# Altium schematic symbol library jlcpcb_2025_04_capacitors_extended_0201.schlib: 1175 symbols (part 6 of 7)
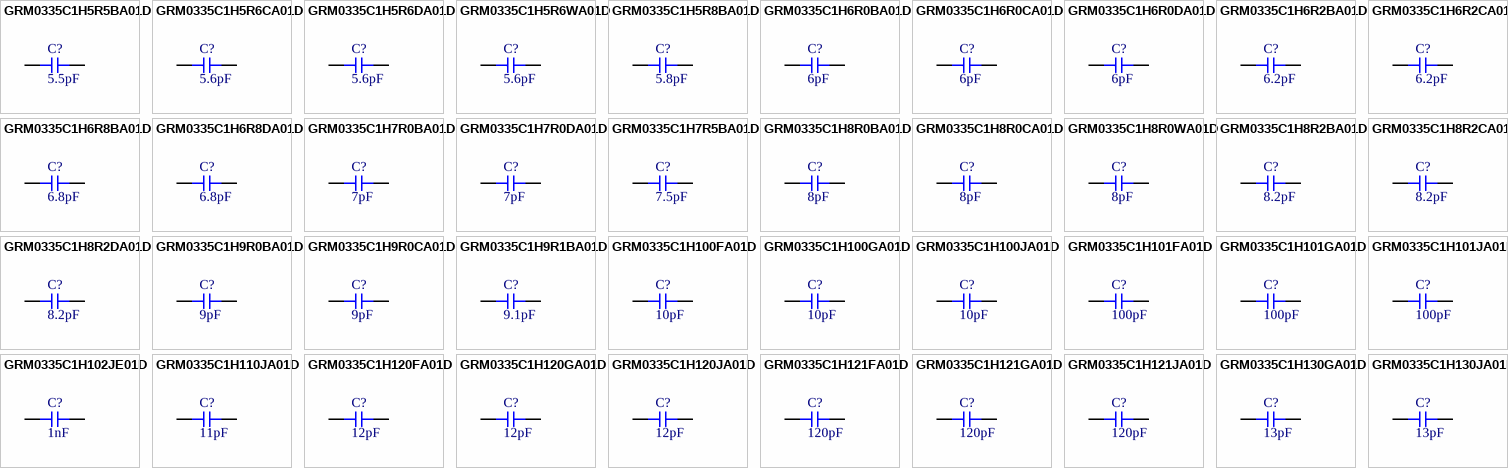
[diagram p34: symbols GRM0335C1H5R5BA01D to GRM0335C1H130JA01D]

## GRM0335C1H5R6CA01D
designator C?  Capacitance: 5.6pF  (hidden comment: *)
Capacitor, Ceramic (MLCC), 5.6pF, 50V, C0G, SMD 0201; Manufacturer: Murata Electronics; Manufacturer Part Number: GRM0335C1H5R6CA01D; Package Size: 0201; JLCPCB Basic Part: No; JLCPCB Part Number: C85914; Supplier 1: LCSC; Category: Capacitors - MLCC; Supplier Part Number 1: C85914; Voltage Rating: 50V; Temperature Coefficient: C0G; RoHS: Yes; ComponentLink1Description: Datasheet; ComponentLink1URL: https://wmsc.lcsc.com/wmsc/upload/file/pdf/v2/lcsc/2304140030_Murata-Electronics-GRM0335C1H5R6CA01D_C85914.pdf; ComponentLink2Description: JLCPCB Part URL; ComponentLink2URL: https://jlcpcb.com/partdetail/C85914; ComponentLink3Description: LCSC Part URL; ComponentLink3URL: https://lcsc.com/product-detail/Multilayer-Ceramic-Capacitors-MLCC---SMD-SMT_Murata-Electronics-Murata-Electronics-GRM0335C1H5R6CA01D_C85914.html
footprint CAP-0201 (0201 (0603M) Capacitor)
pins: 1, 2

## GRM0335C1H5R6DA01D
designator C?  Capacitance: 5.6pF  (hidden comment: *)
Capacitor, Ceramic (MLCC), 5.6pF, null, null, SMD 0201; Manufacturer: Murata Electronics; Manufacturer Part Number: GRM0335C1H5R6DA01D; Package Size: 0201; JLCPCB Basic Part: No; JLCPCB Part Number: C489846; Supplier 1: LCSC; Category: Capacitors - MLCC; Supplier Part Number 1: C489846; Voltage Rating: null; Temperature Coefficient: null; RoHS: Yes; ComponentLink1Description: Datasheet; ComponentLink1URL: https://wmsc.lcsc.com/wmsc/upload/file/pdf/v2/lcsc/2003031432_Murata-Electronics-GRM0335C1H5R6DA01D_C489846.pdf; ComponentLink2Description: JLCPCB Part URL; ComponentLink2URL: https://jlcpcb.com/partdetail/C489846; ComponentLink3Description: LCSC Part URL; ComponentLink3URL: https://lcsc.com/product-detail/Multilayer-Ceramic-Capacitors-MLCC---SMD-SMT_Murata-Electronics-Murata-Electronics-GRM0335C1H5R6DA01D_C489846.html
footprint CAP-0201 (0201 (0603M) Capacitor)
pins: 1, 2

## GRM0335C1H5R6WA01D
designator C?  Capacitance: 5.6pF  (hidden comment: *)
Capacitor, Ceramic (MLCC), 5.6pF, 50V, C0G, SMD 0201; Manufacturer: Murata Electronics; Manufacturer Part Number: GRM0335C1H5R6WA01D; Package Size: 0201; JLCPCB Basic Part: No; JLCPCB Part Number: C1864518; Supplier 1: LCSC; Category: Capacitors - MLCC; Supplier Part Number 1: C1864518; Voltage Rating: 50V; Temperature Coefficient: C0G; RoHS: Yes; ComponentLink1Description: Datasheet; ComponentLink1URL: https://wmsc.lcsc.com/wmsc/upload/file/pdf/v2/lcsc/2201111430_Murata-Electronics-GRM0335C1H5R6WA01D_C1864518.pdf; ComponentLink2Description: JLCPCB Part URL; ComponentLink2URL: https://jlcpcb.com/partdetail/C1864518; ComponentLink3Description: LCSC Part URL; ComponentLink3URL: https://lcsc.com/product-detail/Multilayer-Ceramic-Capacitors-MLCC---SMD-SMT_Murata-Electronics-Murata-Electronics-GRM0335C1H5R6WA01D_C1864518.html
footprint CAP-0201 (0201 (0603M) Capacitor)
pins: 1, 2

## GRM0335C1H5R8BA01D
designator C?  Capacitance: 5.8pF  (hidden comment: *)
Capacitor, Ceramic (MLCC), 5.8pF, 50V, null, SMD 0201; Manufacturer: Murata Electronics; Manufacturer Part Number: GRM0335C1H5R8BA01D; Package Size: 0201; JLCPCB Basic Part: No; JLCPCB Part Number: C2183849; Supplier 1: LCSC; Category: Capacitors - MLCC; Supplier Part Number 1: C2183849; Voltage Rating: 50V; Temperature Coefficient: null; RoHS: Yes; ComponentLink1Description: Datasheet; ComponentLink1URL: https://wmsc.lcsc.com/wmsc/upload/file/pdf/v2/lcsc/2202041400_Murata-Electronics-GRM0335C1H5R8BA01D_C2183849.pdf; ComponentLink2Description: JLCPCB Part URL; ComponentLink2URL: https://jlcpcb.com/partdetail/C2183849; ComponentLink3Description: LCSC Part URL; ComponentLink3URL: https://lcsc.com/product-detail/Multilayer-Ceramic-Capacitors-MLCC---SMD-SMT_Murata-Electronics-Murata-Electronics-GRM0335C1H5R8BA01D_C2183849.html
footprint CAP-0201 (0201 (0603M) Capacitor)
pins: 1, 2

## GRM0335C1H6R0BA01D
designator C?  Capacitance: 6pF  (hidden comment: *)
Capacitor, Ceramic (MLCC), 6pF, 50V, C0G, SMD 0201; Manufacturer: Murata Electronics; Manufacturer Part Number: GRM0335C1H6R0BA01D; Package Size: 0201; JLCPCB Basic Part: No; JLCPCB Part Number: C161434; Supplier 1: LCSC; Category: Capacitors - MLCC; Supplier Part Number 1: C161434; Voltage Rating: 50V; Temperature Coefficient: C0G; RoHS: Yes; ComponentLink1Description: Datasheet; ComponentLink1URL: https://wmsc.lcsc.com/wmsc/upload/file/pdf/v2/lcsc/2304140030_Murata-Electronics-GRM0335C1H6R0BA01D_C161434.pdf; ComponentLink2Description: JLCPCB Part URL; ComponentLink2URL: https://jlcpcb.com/partdetail/C161434; ComponentLink3Description: LCSC Part URL; ComponentLink3URL: https://lcsc.com/product-detail/Multilayer-Ceramic-Capacitors-MLCC---SMD-SMT_Murata-Electronics-Murata-Electronics-GRM0335C1H6R0BA01D_C161434.html
footprint CAP-0201 (0201 (0603M) Capacitor)
pins: 1, 2

## GRM0335C1H6R0CA01D
designator C?  Capacitance: 6pF  (hidden comment: *)
Capacitor, Ceramic (MLCC), 6pF, 50V, C0G, SMD 0201; Manufacturer: Murata Electronics; Manufacturer Part Number: GRM0335C1H6R0CA01D; Package Size: 0201; JLCPCB Basic Part: No; JLCPCB Part Number: C85915; Supplier 1: LCSC; Category: Capacitors - MLCC; Supplier Part Number 1: C85915; Voltage Rating: 50V; Temperature Coefficient: C0G; RoHS: Yes; ComponentLink1Description: Datasheet; ComponentLink1URL: https://wmsc.lcsc.com/wmsc/upload/file/pdf/v2/lcsc/2304140030_Murata-Electronics-GRM0335C1H6R0CA01D_C85915.pdf; ComponentLink2Description: JLCPCB Part URL; ComponentLink2URL: https://jlcpcb.com/partdetail/C85915; ComponentLink3Description: LCSC Part URL; ComponentLink3URL: https://lcsc.com/product-detail/Multilayer-Ceramic-Capacitors-MLCC---SMD-SMT_Murata-Electronics-Murata-Electronics-GRM0335C1H6R0CA01D_C85915.html
footprint CAP-0201 (0201 (0603M) Capacitor)
pins: 1, 2

## GRM0335C1H6R0DA01D
designator C?  Capacitance: 6pF  (hidden comment: *)
Capacitor, Ceramic (MLCC), 6pF, 50V, C0G, SMD 0201; Manufacturer: Murata Electronics; Manufacturer Part Number: GRM0335C1H6R0DA01D; Package Size: 0201; JLCPCB Basic Part: No; JLCPCB Part Number: C161435; Supplier 1: LCSC; Category: Capacitors - MLCC; Supplier Part Number 1: C161435; Voltage Rating: 50V; Temperature Coefficient: C0G; RoHS: Yes; ComponentLink1Description: Datasheet; ComponentLink1URL: https://wmsc.lcsc.com/wmsc/upload/file/pdf/v2/lcsc/1811081513_Murata-Electronics-GRM0335C1H6R0DA01D_C161435.pdf; ComponentLink2Description: JLCPCB Part URL; ComponentLink2URL: https://jlcpcb.com/partdetail/C161435; ComponentLink3Description: LCSC Part URL; ComponentLink3URL: https://lcsc.com/product-detail/Multilayer-Ceramic-Capacitors-MLCC---SMD-SMT_Murata-Electronics-Murata-Electronics-GRM0335C1H6R0DA01D_C161435.html
footprint CAP-0201 (0201 (0603M) Capacitor)
pins: 1, 2

## GRM0335C1H6R2BA01D
designator C?  Capacitance: 6.2pF  (hidden comment: *)
Capacitor, Ceramic (MLCC), 6.2pF, null, null, SMD 0201; Manufacturer: Murata Electronics; Manufacturer Part Number: GRM0335C1H6R2BA01D; Package Size: 0201; JLCPCB Basic Part: No; JLCPCB Part Number: C385002; Supplier 1: LCSC; Category: Capacitors - MLCC; Supplier Part Number 1: C385002; Voltage Rating: null; Temperature Coefficient: null; RoHS: Yes; ComponentLink1Description: Datasheet; ComponentLink1URL: https://wmsc.lcsc.com/wmsc/upload/file/pdf/v2/lcsc/2104161832_Murata-Electronics-GRM0335C1H6R2BA01D_C385002.pdf; ComponentLink2Description: JLCPCB Part URL; ComponentLink2URL: https://jlcpcb.com/partdetail/C385002; ComponentLink3Description: LCSC Part URL; ComponentLink3URL: https://lcsc.com/product-detail/Multilayer-Ceramic-Capacitors-MLCC---SMD-SMT_Murata-Electronics-Murata-Electronics-GRM0335C1H6R2BA01D_C385002.html
footprint CAP-0201 (0201 (0603M) Capacitor)
pins: 1, 2

## GRM0335C1H6R2CA01D
designator C?  Capacitance: 6.2pF  (hidden comment: *)
Capacitor, Ceramic (MLCC), 6.2pF, 50V, C0G, SMD 0201; Manufacturer: Murata Electronics; Manufacturer Part Number: GRM0335C1H6R2CA01D; Package Size: 0201; JLCPCB Basic Part: No; JLCPCB Part Number: C385003; Supplier 1: LCSC; Category: Capacitors - MLCC; Supplier Part Number 1: C385003; Voltage Rating: 50V; Temperature Coefficient: C0G; RoHS: Yes; ComponentLink1Description: Datasheet; ComponentLink1URL: https://wmsc.lcsc.com/wmsc/upload/file/pdf/v2/lcsc/2109180930_Murata-Electronics-GRM0335C1H6R2CA01D_C385003.pdf; ComponentLink2Description: JLCPCB Part URL; ComponentLink2URL: https://jlcpcb.com/partdetail/C385003; ComponentLink3Description: LCSC Part URL; ComponentLink3URL: https://lcsc.com/product-detail/Multilayer-Ceramic-Capacitors-MLCC---SMD-SMT_Murata-Electronics-Murata-Electronics-GRM0335C1H6R2CA01D_C385003.html
footprint CAP-0201 (0201 (0603M) Capacitor)
pins: 1, 2

## GRM0335C1H6R8BA01D
designator C?  Capacitance: 6.8pF  (hidden comment: *)
Capacitor, Ceramic (MLCC), 6.8pF, 50V, C0G, SMD 0201; Manufacturer: Murata Electronics; Manufacturer Part Number: GRM0335C1H6R8BA01D; Package Size: 0201; JLCPCB Basic Part: No; JLCPCB Part Number: C237537; Supplier 1: LCSC; Category: Capacitors - MLCC; Supplier Part Number 1: C237537; Voltage Rating: 50V; Temperature Coefficient: C0G; RoHS: Yes; ComponentLink1Description: Datasheet; ComponentLink1URL: https://wmsc.lcsc.com/wmsc/upload/file/pdf/v2/lcsc/2304140030_Murata-Electronics-GRM0335C1H6R8BA01D_C237537.pdf; ComponentLink2Description: JLCPCB Part URL; ComponentLink2URL: https://jlcpcb.com/partdetail/C237537; ComponentLink3Description: LCSC Part URL; ComponentLink3URL: https://lcsc.com/product-detail/Multilayer-Ceramic-Capacitors-MLCC---SMD-SMT_Murata-Electronics-Murata-Electronics-GRM0335C1H6R8BA01D_C237537.html
footprint CAP-0201 (0201 (0603M) Capacitor)
pins: 1, 2

## GRM0335C1H6R8DA01D
designator C?  Capacitance: 6.8pF  (hidden comment: *)
Capacitor, Ceramic (MLCC), 6.8pF, 50V, C0G, SMD 0201; Manufacturer: Murata Electronics; Manufacturer Part Number: GRM0335C1H6R8DA01D; Package Size: 0201; JLCPCB Basic Part: No; JLCPCB Part Number: C576428; Supplier 1: LCSC; Category: Capacitors - MLCC; Supplier Part Number 1: C576428; Voltage Rating: 50V; Temperature Coefficient: C0G; RoHS: Yes; ComponentLink1Description: Datasheet; ComponentLink1URL: https://wmsc.lcsc.com/wmsc/upload/file/pdf/v2/lcsc/2206021745_Murata-Electronics-GRM0335C1H6R8DA01D_C576428.pdf; ComponentLink2Description: JLCPCB Part URL; ComponentLink2URL: https://jlcpcb.com/partdetail/C576428; ComponentLink3Description: LCSC Part URL; ComponentLink3URL: https://lcsc.com/product-detail/Multilayer-Ceramic-Capacitors-MLCC---SMD-SMT_Murata-Electronics-Murata-Electronics-GRM0335C1H6R8DA01D_C576428.html
footprint CAP-0201 (0201 (0603M) Capacitor)
pins: 1, 2

## GRM0335C1H7R0BA01D
designator C?  Capacitance: 7pF  (hidden comment: *)
Capacitor, Ceramic (MLCC), 7pF, 50V, C0G, SMD 0201; Manufacturer: Murata Electronics; Manufacturer Part Number: GRM0335C1H7R0BA01D; Package Size: 0201; JLCPCB Basic Part: No; JLCPCB Part Number: C161436; Supplier 1: LCSC; Category: Capacitors - MLCC; Supplier Part Number 1: C161436; Voltage Rating: 50V; Temperature Coefficient: C0G; RoHS: Yes; ComponentLink1Description: Datasheet; ComponentLink1URL: https://wmsc.lcsc.com/wmsc/upload/file/pdf/v2/lcsc/2304140030_Murata-Electronics-GRM0335C1H7R0BA01D_C161436.pdf; ComponentLink2Description: JLCPCB Part URL; ComponentLink2URL: https://jlcpcb.com/partdetail/C161436; ComponentLink3Description: LCSC Part URL; ComponentLink3URL: https://lcsc.com/product-detail/Multilayer-Ceramic-Capacitors-MLCC---SMD-SMT_Murata-Electronics-Murata-Electronics-GRM0335C1H7R0BA01D_C161436.html
footprint CAP-0201 (0201 (0603M) Capacitor)
pins: 1, 2

## GRM0335C1H7R0DA01D
designator C?  Capacitance: 7pF  (hidden comment: *)
Capacitor, Ceramic (MLCC), 7pF, 50V, X7T, SMD 0201; Manufacturer: Murata Electronics; Manufacturer Part Number: GRM0335C1H7R0DA01D; Package Size: 0201; JLCPCB Basic Part: No; JLCPCB Part Number: C385005; Supplier 1: LCSC; Category: Capacitors - MLCC; Supplier Part Number 1: C385005; Voltage Rating: 50V; Temperature Coefficient: X7T; RoHS: Yes; ComponentLink1Description: Datasheet; ComponentLink1URL: https://wmsc.lcsc.com/wmsc/upload/file/pdf/v2/lcsc/2108182030_Murata-Electronics-GRM0335C1H7R0DA01D_C385005.pdf; ComponentLink2Description: JLCPCB Part URL; ComponentLink2URL: https://jlcpcb.com/partdetail/C385005; ComponentLink3Description: LCSC Part URL; ComponentLink3URL: https://lcsc.com/product-detail/Multilayer-Ceramic-Capacitors-MLCC---SMD-SMT_Murata-Electronics-Murata-Electronics-GRM0335C1H7R0DA01D_C385005.html
footprint CAP-0201 (0201 (0603M) Capacitor)
pins: 1, 2

## GRM0335C1H7R5BA01D
designator C?  Capacitance: 7.5pF  (hidden comment: *)
Capacitor, Ceramic (MLCC), 7.5pF, null, null, SMD 0201; Manufacturer: Murata Electronics; Manufacturer Part Number: GRM0335C1H7R5BA01D; Package Size: 0201; JLCPCB Basic Part: No; JLCPCB Part Number: C385006; Supplier 1: LCSC; Category: Capacitors - MLCC; Supplier Part Number 1: C385006; Voltage Rating: null; Temperature Coefficient: null; RoHS: Yes; ComponentLink1Description: Datasheet; ComponentLink1URL: https://wmsc.lcsc.com/wmsc/upload/file/pdf/v2/lcsc/2304140030_Murata-Electronics-GRM0335C1H7R5BA01D_C385006.pdf; ComponentLink2Description: JLCPCB Part URL; ComponentLink2URL: https://jlcpcb.com/partdetail/C385006; ComponentLink3Description: LCSC Part URL; ComponentLink3URL: https://lcsc.com/product-detail/Multilayer-Ceramic-Capacitors-MLCC---SMD-SMT_Murata-Electronics-Murata-Electronics-GRM0335C1H7R5BA01D_C385006.html
footprint CAP-0201 (0201 (0603M) Capacitor)
pins: 1, 2

## GRM0335C1H8R0BA01D
designator C?  Capacitance: 8pF  (hidden comment: *)
Capacitor, Ceramic (MLCC), 8pF, 50V, C0G, SMD 0201; Manufacturer: Murata Electronics; Manufacturer Part Number: GRM0335C1H8R0BA01D; Package Size: 0201; JLCPCB Basic Part: No; JLCPCB Part Number: C237417; Supplier 1: LCSC; Category: Capacitors - MLCC; Supplier Part Number 1: C237417; Voltage Rating: 50V; Temperature Coefficient: C0G; RoHS: Yes; ComponentLink1Description: Datasheet; ComponentLink1URL: https://wmsc.lcsc.com/wmsc/upload/file/pdf/v2/lcsc/1912111437_Murata-Electronics-GRM0335C1H8R0BA01D_C237417.pdf; ComponentLink2Description: JLCPCB Part URL; ComponentLink2URL: https://jlcpcb.com/partdetail/C237417; ComponentLink3Description: LCSC Part URL; ComponentLink3URL: https://lcsc.com/product-detail/Multilayer-Ceramic-Capacitors-MLCC---SMD-SMT_Murata-Electronics-Murata-Electronics-GRM0335C1H8R0BA01D_C237417.html
footprint CAP-0201 (0201 (0603M) Capacitor)
pins: 1, 2

## GRM0335C1H8R0CA01D
designator C?  Capacitance: 8pF  (hidden comment: *)
Capacitor, Ceramic (MLCC), 8pF, 50V, C0G, SMD 0201; Manufacturer: Murata Electronics; Manufacturer Part Number: GRM0335C1H8R0CA01D; Package Size: 0201; JLCPCB Basic Part: No; JLCPCB Part Number: C85917; Supplier 1: LCSC; Category: Capacitors - MLCC; Supplier Part Number 1: C85917; Voltage Rating: 50V; Temperature Coefficient: C0G; RoHS: Yes; ComponentLink1Description: Datasheet; ComponentLink1URL: https://wmsc.lcsc.com/wmsc/upload/file/pdf/v2/lcsc/2304140030_Murata-Electronics-GRM0335C1H8R0CA01D_C85917.pdf; ComponentLink2Description: JLCPCB Part URL; ComponentLink2URL: https://jlcpcb.com/partdetail/C85917; ComponentLink3Description: LCSC Part URL; ComponentLink3URL: https://lcsc.com/product-detail/Multilayer-Ceramic-Capacitors-MLCC---SMD-SMT_Murata-Electronics-Murata-Electronics-GRM0335C1H8R0CA01D_C85917.html
footprint CAP-0201 (0201 (0603M) Capacitor)
pins: 1, 2

## GRM0335C1H8R0WA01D
designator C?  Capacitance: 8pF  (hidden comment: *)
Capacitor, Ceramic (MLCC), 8pF, 50V, C0G, SMD 0201; Manufacturer: Murata Electronics; Manufacturer Part Number: GRM0335C1H8R0WA01D; Package Size: 0201; JLCPCB Basic Part: No; JLCPCB Part Number: C3840357; Supplier 1: LCSC; Category: Capacitors - MLCC; Supplier Part Number 1: C3840357; Voltage Rating: 50V; Temperature Coefficient: C0G; RoHS: Yes; ComponentLink1Description: Datasheet; ComponentLink1URL: https://wmsc.lcsc.com/wmsc/upload/file/pdf/v2/lcsc/2308111501_Murata-Electronics-GRM0335C1H8R0WA01D_C3840357.pdf; ComponentLink2Description: JLCPCB Part URL; ComponentLink2URL: https://jlcpcb.com/partdetail/C3840357; ComponentLink3Description: LCSC Part URL; ComponentLink3URL: https://lcsc.com/product-detail/Multilayer-Ceramic-Capacitors-MLCC---SMD-SMT_Murata-Electronics-Murata-Electronics-GRM0335C1H8R0WA01D_C3840357.html
footprint CAP-0201 (0201 (0603M) Capacitor)
pins: 1, 2

## GRM0335C1H8R2BA01D
designator C?  Capacitance: 8.2pF  (hidden comment: *)
Capacitor, Ceramic (MLCC), 8.2pF, 50V, C0G, SMD 0201; Manufacturer: Murata Electronics; Manufacturer Part Number: GRM0335C1H8R2BA01D; Package Size: 0201; JLCPCB Basic Part: No; JLCPCB Part Number: C161441; Supplier 1: LCSC; Category: Capacitors - MLCC; Supplier Part Number 1: C161441; Voltage Rating: 50V; Temperature Coefficient: C0G; RoHS: Yes; ComponentLink1Description: Datasheet; ComponentLink1URL: https://wmsc.lcsc.com/wmsc/upload/file/pdf/v2/lcsc/1811081551_Murata-Electronics-GRM0335C1H8R2BA01D_C161441.pdf; ComponentLink2Description: JLCPCB Part URL; ComponentLink2URL: https://jlcpcb.com/partdetail/C161441; ComponentLink3Description: LCSC Part URL; ComponentLink3URL: https://lcsc.com/product-detail/Multilayer-Ceramic-Capacitors-MLCC---SMD-SMT_Murata-Electronics-Murata-Electronics-GRM0335C1H8R2BA01D_C161441.html
footprint CAP-0201 (0201 (0603M) Capacitor)
pins: 1, 2

## GRM0335C1H8R2CA01D
designator C?  Capacitance: 8.2pF  (hidden comment: *)
Capacitor, Ceramic (MLCC), 8.2pF, 50V, C0G, SMD 0201; Manufacturer: Murata Electronics; Manufacturer Part Number: GRM0335C1H8R2CA01D; Package Size: 0201; JLCPCB Basic Part: No; JLCPCB Part Number: C85918; Supplier 1: LCSC; Category: Capacitors - MLCC; Supplier Part Number 1: C85918; Voltage Rating: 50V; Temperature Coefficient: C0G; RoHS: Yes; ComponentLink1Description: Datasheet; ComponentLink1URL: https://wmsc.lcsc.com/wmsc/upload/file/pdf/v2/lcsc/2304140030_Murata-Electronics-GRM0335C1H8R2CA01D_C85918.pdf; ComponentLink2Description: JLCPCB Part URL; ComponentLink2URL: https://jlcpcb.com/partdetail/C85918; ComponentLink3Description: LCSC Part URL; ComponentLink3URL: https://lcsc.com/product-detail/Multilayer-Ceramic-Capacitors-MLCC---SMD-SMT_Murata-Electronics-Murata-Electronics-GRM0335C1H8R2CA01D_C85918.html
footprint CAP-0201 (0201 (0603M) Capacitor)
pins: 1, 2

## GRM0335C1H8R2DA01D
designator C?  Capacitance: 8.2pF  (hidden comment: *)
Capacitor, Ceramic (MLCC), 8.2pF, 50V, C0G, SMD 0201; Manufacturer: Murata Electronics; Manufacturer Part Number: GRM0335C1H8R2DA01D; Package Size: 0201; JLCPCB Basic Part: No; JLCPCB Part Number: C161442; Supplier 1: LCSC; Category: Capacitors - MLCC; Supplier Part Number 1: C161442; Voltage Rating: 50V; Temperature Coefficient: C0G; RoHS: Yes; ComponentLink1Description: Datasheet; ComponentLink1URL: https://wmsc.lcsc.com/wmsc/upload/file/pdf/v2/lcsc/2304140030_Murata-Electronics-GRM0335C1H8R2DA01D_C161442.pdf; ComponentLink2Description: JLCPCB Part URL; ComponentLink2URL: https://jlcpcb.com/partdetail/C161442; ComponentLink3Description: LCSC Part URL; ComponentLink3URL: https://lcsc.com/product-detail/Multilayer-Ceramic-Capacitors-MLCC---SMD-SMT_Murata-Electronics-Murata-Electronics-GRM0335C1H8R2DA01D_C161442.html
footprint CAP-0201 (0201 (0603M) Capacitor)
pins: 1, 2

## GRM0335C1H9R0BA01D
designator C?  Capacitance: 9pF  (hidden comment: *)
Capacitor, Ceramic (MLCC), 9pF, 50V, C0G, SMD 0201; Manufacturer: Murata Electronics; Manufacturer Part Number: GRM0335C1H9R0BA01D; Package Size: 0201; JLCPCB Basic Part: No; JLCPCB Part Number: C161443; Supplier 1: LCSC; Category: Capacitors - MLCC; Supplier Part Number 1: C161443; Voltage Rating: 50V; Temperature Coefficient: C0G; RoHS: Yes; ComponentLink1Description: Datasheet; ComponentLink1URL: https://wmsc.lcsc.com/wmsc/upload/file/pdf/v2/lcsc/2304140030_Murata-Electronics-GRM0335C1H9R0BA01D_C161443.pdf; ComponentLink2Description: JLCPCB Part URL; ComponentLink2URL: https://jlcpcb.com/partdetail/C161443; ComponentLink3Description: LCSC Part URL; ComponentLink3URL: https://lcsc.com/product-detail/Multilayer-Ceramic-Capacitors-MLCC---SMD-SMT_Murata-Electronics-Murata-Electronics-GRM0335C1H9R0BA01D_C161443.html
footprint CAP-0201 (0201 (0603M) Capacitor)
pins: 1, 2

## GRM0335C1H9R0CA01D
designator C?  Capacitance: 9pF  (hidden comment: *)
Capacitor, Ceramic (MLCC), 9pF, 50V, C0G, SMD 0201; Manufacturer: Murata Electronics; Manufacturer Part Number: GRM0335C1H9R0CA01D; Package Size: 0201; JLCPCB Basic Part: No; JLCPCB Part Number: C161444; Supplier 1: LCSC; Category: Capacitors - MLCC; Supplier Part Number 1: C161444; Voltage Rating: 50V; Temperature Coefficient: C0G; RoHS: Yes; ComponentLink1Description: Datasheet; ComponentLink1URL: https://wmsc.lcsc.com/wmsc/upload/file/pdf/v2/lcsc/1912111437_Murata-Electronics-GRM0335C1H9R0CA01D_C161444.pdf; ComponentLink2Description: JLCPCB Part URL; ComponentLink2URL: https://jlcpcb.com/partdetail/C161444; ComponentLink3Description: LCSC Part URL; ComponentLink3URL: https://lcsc.com/product-detail/Multilayer-Ceramic-Capacitors-MLCC---SMD-SMT_Murata-Electronics-Murata-Electronics-GRM0335C1H9R0CA01D_C161444.html
footprint CAP-0201 (0201 (0603M) Capacitor)
pins: 1, 2

## GRM0335C1H9R1BA01D
designator C?  Capacitance: 9.1pF  (hidden comment: *)
Capacitor, Ceramic (MLCC), 9.1pF, null, null, SMD 0201; Manufacturer: Murata Electronics; Manufacturer Part Number: GRM0335C1H9R1BA01D; Package Size: 0201; JLCPCB Basic Part: No; JLCPCB Part Number: C440160; Supplier 1: LCSC; Category: Capacitors - MLCC; Supplier Part Number 1: C440160; Voltage Rating: null; Temperature Coefficient: null; RoHS: Yes; ComponentLink1Description: Datasheet; ComponentLink1URL: https://wmsc.lcsc.com/wmsc/upload/file/pdf/v2/lcsc/2304140030_Murata-Electronics-GRM0335C1H9R1BA01D_C440160.pdf; ComponentLink2Description: JLCPCB Part URL; ComponentLink2URL: https://jlcpcb.com/partdetail/C440160; ComponentLink3Description: LCSC Part URL; ComponentLink3URL: https://lcsc.com/product-detail/Multilayer-Ceramic-Capacitors-MLCC---SMD-SMT_Murata-Electronics-Murata-Electronics-GRM0335C1H9R1BA01D_C440160.html
footprint CAP-0201 (0201 (0603M) Capacitor)
pins: 1, 2

## GRM0335C1H100FA01D
designator C?  Capacitance: 10pF  (hidden comment: *)
Capacitor, Ceramic (MLCC), 10pF, ±1%, 50V, C0G, ±1%, SMD 0201; Manufacturer: Murata Electronics; Manufacturer Part Number: GRM0335C1H100FA01D; Package Size: 0201; JLCPCB Basic Part: No; JLCPCB Part Number: C384956; Supplier 1: LCSC; Category: Capacitors - MLCC; Supplier Part Number 1: C384956; Tolerance: ±1%; Voltage Rating: 50V; Temperature Coefficient: C0G; RoHS: Yes; ComponentLink1Description: Datasheet; ComponentLink1URL: https://wmsc.lcsc.com/wmsc/upload/file/pdf/v2/lcsc/2304140030_Murata-Electronics-GRM0335C1H100FA01D_C384956.pdf; ComponentLink2Description: JLCPCB Part URL; ComponentLink2URL: https://jlcpcb.com/partdetail/C384956; ComponentLink3Description: LCSC Part URL; ComponentLink3URL: https://lcsc.com/product-detail/Multilayer-Ceramic-Capacitors-MLCC---SMD-SMT_Murata-Electronics-Murata-Electronics-GRM0335C1H100FA01D_C384956.html
footprint CAP-0201 (0201 (0603M) Capacitor)
pins: 1, 2

## GRM0335C1H100GA01D
designator C?  Capacitance: 10pF  (hidden comment: *)
Capacitor, Ceramic (MLCC), 10pF, ±2%, 50V, C0G, ±2%, SMD 0201; Manufacturer: Murata Electronics; Manufacturer Part Number: GRM0335C1H100GA01D; Package Size: 0201; JLCPCB Basic Part: No; JLCPCB Part Number: C85889; Supplier 1: LCSC; Category: Capacitors - MLCC; Supplier Part Number 1: C85889; Tolerance: ±2%; Voltage Rating: 50V; Temperature Coefficient: C0G; RoHS: Yes; ComponentLink1Description: Datasheet; ComponentLink1URL: https://wmsc.lcsc.com/wmsc/upload/file/pdf/v2/lcsc/2304140030_Murata-Electronics-GRM0335C1H100GA01D_C85889.pdf; ComponentLink2Description: JLCPCB Part URL; ComponentLink2URL: https://jlcpcb.com/partdetail/C85889; ComponentLink3Description: LCSC Part URL; ComponentLink3URL: https://lcsc.com/product-detail/Multilayer-Ceramic-Capacitors-MLCC---SMD-SMT_Murata-Electronics-Murata-Electronics-GRM0335C1H100GA01D_C85889.html
footprint CAP-0201 (0201 (0603M) Capacitor)
pins: 1, 2

## GRM0335C1H100JA01D
designator C?  Capacitance: 10pF  (hidden comment: *)
Capacitor, Ceramic (MLCC), 10pF, ±5%, 50V, C0G, ±5%, SMD 0201; Manufacturer: Murata Electronics; Manufacturer Part Number: GRM0335C1H100JA01D; Package Size: 0201; JLCPCB Basic Part: No; JLCPCB Part Number: C76921; Supplier 1: LCSC; Category: Capacitors - MLCC; Supplier Part Number 1: C76921; Tolerance: ±5%; Voltage Rating: 50V; Temperature Coefficient: C0G; RoHS: Yes; ComponentLink1Description: Datasheet; ComponentLink1URL: https://wmsc.lcsc.com/wmsc/upload/file/pdf/v2/lcsc/1811081513_Murata-Electronics-GRM0335C1H100JA01D_C76921.pdf; ComponentLink2Description: JLCPCB Part URL; ComponentLink2URL: https://jlcpcb.com/partdetail/C76921; ComponentLink3Description: LCSC Part URL; ComponentLink3URL: https://lcsc.com/product-detail/Multilayer-Ceramic-Capacitors-MLCC---SMD-SMT_Murata-Electronics-Murata-Electronics-GRM0335C1H100JA01D_C76921.html
footprint CAP-0201 (0201 (0603M) Capacitor)
pins: 1, 2

## GRM0335C1H101FA01D
designator C?  Capacitance: 100pF  (hidden comment: *)
Capacitor, Ceramic (MLCC), 100pF, ±1%, 50V, null, ±1%, SMD 0201; Manufacturer: Murata Electronics; Manufacturer Part Number: GRM0335C1H101FA01D; Package Size: 0201; JLCPCB Basic Part: No; JLCPCB Part Number: C384957; Supplier 1: LCSC; Category: Capacitors - MLCC; Supplier Part Number 1: C384957; Tolerance: ±1%; Voltage Rating: 50V; Temperature Coefficient: null; RoHS: Yes; ComponentLink1Description: Datasheet; ComponentLink1URL: https://wmsc.lcsc.com/wmsc/upload/file/pdf/v2/lcsc/2112211830_Murata-Electronics-GRM0335C1H101FA01D_C384957.pdf; ComponentLink2Description: JLCPCB Part URL; ComponentLink2URL: https://jlcpcb.com/partdetail/C384957; ComponentLink3Description: LCSC Part URL; ComponentLink3URL: https://lcsc.com/product-detail/Multilayer-Ceramic-Capacitors-MLCC---SMD-SMT_Murata-Electronics-Murata-Electronics-GRM0335C1H101FA01D_C384957.html
footprint CAP-0201 (0201 (0603M) Capacitor)
pins: 1, 2

## GRM0335C1H101GA01D
designator C?  Capacitance: 100pF  (hidden comment: *)
Capacitor, Ceramic (MLCC), 100pF, ±2%, 50V, C0G, ±2%, SMD 0201; Manufacturer: Murata Electronics; Manufacturer Part Number: GRM0335C1H101GA01D; Package Size: 0201; JLCPCB Basic Part: No; JLCPCB Part Number: C161403; Supplier 1: LCSC; Category: Capacitors - MLCC; Supplier Part Number 1: C161403; Tolerance: ±2%; Voltage Rating: 50V; Temperature Coefficient: C0G; RoHS: Yes; ComponentLink1Description: Datasheet; ComponentLink1URL: https://wmsc.lcsc.com/wmsc/upload/file/pdf/v2/lcsc/2304140030_Murata-Electronics-GRM0335C1H101GA01D_C161403.pdf; ComponentLink2Description: JLCPCB Part URL; ComponentLink2URL: https://jlcpcb.com/partdetail/C161403; ComponentLink3Description: LCSC Part URL; ComponentLink3URL: https://lcsc.com/product-detail/Multilayer-Ceramic-Capacitors-MLCC---SMD-SMT_Murata-Electronics-Murata-Electronics-GRM0335C1H101GA01D_C161403.html
footprint CAP-0201 (0201 (0603M) Capacitor)
pins: 1, 2

## GRM0335C1H101JA01D
designator C?  Capacitance: 100pF  (hidden comment: *)
Capacitor, Ceramic (MLCC), 100pF, ±5%, 50V, C0G, ±5%, SMD 0201; Manufacturer: Murata Electronics; Manufacturer Part Number: GRM0335C1H101JA01D; Package Size: 0201; JLCPCB Basic Part: No; JLCPCB Part Number: C76922; Supplier 1: LCSC; Category: Capacitors - MLCC; Supplier Part Number 1: C76922; Tolerance: ±5%; Voltage Rating: 50V; Temperature Coefficient: C0G; RoHS: Yes; ComponentLink1Description: Datasheet; ComponentLink1URL: https://wmsc.lcsc.com/wmsc/upload/file/pdf/v2/lcsc/1811081531_Murata-Electronics-GRM0335C1H101JA01D_C76922.pdf; ComponentLink2Description: JLCPCB Part URL; ComponentLink2URL: https://jlcpcb.com/partdetail/C76922; ComponentLink3Description: LCSC Part URL; ComponentLink3URL: https://lcsc.com/product-detail/Multilayer-Ceramic-Capacitors-MLCC---SMD-SMT_Murata-Electronics-Murata-Electronics-GRM0335C1H101JA01D_C76922.html
footprint CAP-0201 (0201 (0603M) Capacitor)
pins: 1, 2

## GRM0335C1H102JE01D
designator C?  Capacitance: 1nF  (hidden comment: *)
Capacitor, Ceramic (MLCC), 1nF, ±5%, 50V, C0G, ±5%, SMD 0201; Manufacturer: Murata Electronics; Manufacturer Part Number: GRM0335C1H102JE01D; Package Size: 0201; JLCPCB Basic Part: No; JLCPCB Part Number: C3870067; Supplier 1: LCSC; Category: Capacitors - MLCC; Supplier Part Number 1: C3870067; Tolerance: ±5%; Voltage Rating: 50V; Temperature Coefficient: C0G; RoHS: Yes; ComponentLink1Description: Datasheet; ComponentLink1URL: https://wmsc.lcsc.com/wmsc/upload/file/pdf/v2/lcsc/2308111458_Murata-Electronics-GRM0335C1H102JE01D_C3870067.pdf; ComponentLink2Description: JLCPCB Part URL; ComponentLink2URL: https://jlcpcb.com/partdetail/C3870067; ComponentLink3Description: LCSC Part URL; ComponentLink3URL: https://lcsc.com/product-detail/Multilayer-Ceramic-Capacitors-MLCC---SMD-SMT_Murata-Electronics-Murata-Electronics-GRM0335C1H102JE01D_C3870067.html
footprint CAP-0201 (0201 (0603M) Capacitor)
pins: 1, 2

## GRM0335C1H110JA01D
designator C?  Capacitance: 11pF  (hidden comment: *)
Capacitor, Ceramic (MLCC), 11pF, ±5%, 50V, C0G, ±5%, SMD 0201; Manufacturer: Murata Electronics; Manufacturer Part Number: GRM0335C1H110JA01D; Package Size: 0201; JLCPCB Basic Part: No; JLCPCB Part Number: C384959; Supplier 1: LCSC; Category: Capacitors - MLCC; Supplier Part Number 1: C384959; Tolerance: ±5%; Voltage Rating: 50V; Temperature Coefficient: C0G; RoHS: Yes; ComponentLink1Description: Datasheet; ComponentLink1URL: https://wmsc.lcsc.com/wmsc/upload/file/pdf/v2/lcsc/1912111437_Murata-Electronics-GRM0335C1H110JA01D_C384959.pdf; ComponentLink2Description: JLCPCB Part URL; ComponentLink2URL: https://jlcpcb.com/partdetail/C384959; ComponentLink3Description: LCSC Part URL; ComponentLink3URL: https://lcsc.com/product-detail/Multilayer-Ceramic-Capacitors-MLCC---SMD-SMT_Murata-Electronics-Murata-Electronics-GRM0335C1H110JA01D_C384959.html
footprint CAP-0201 (0201 (0603M) Capacitor)
pins: 1, 2

## GRM0335C1H120FA01D
designator C?  Capacitance: 12pF  (hidden comment: *)
Capacitor, Ceramic (MLCC), 12pF, ±1%, 50V, C0G, ±1%, SMD 0201; Manufacturer: Murata Electronics; Manufacturer Part Number: GRM0335C1H120FA01D; Package Size: 0201; JLCPCB Basic Part: No; JLCPCB Part Number: C384960; Supplier 1: LCSC; Category: Capacitors - MLCC; Supplier Part Number 1: C384960; Tolerance: ±1%; Voltage Rating: 50V; Temperature Coefficient: C0G; RoHS: Yes; ComponentLink1Description: Datasheet; ComponentLink1URL: https://wmsc.lcsc.com/wmsc/upload/file/pdf/v2/lcsc/2008261837_Murata-Electronics-GRM0335C1H120FA01D_C384960.pdf; ComponentLink2Description: JLCPCB Part URL; ComponentLink2URL: https://jlcpcb.com/partdetail/C384960; ComponentLink3Description: LCSC Part URL; ComponentLink3URL: https://lcsc.com/product-detail/Multilayer-Ceramic-Capacitors-MLCC---SMD-SMT_Murata-Electronics-Murata-Electronics-GRM0335C1H120FA01D_C384960.html
footprint CAP-0201 (0201 (0603M) Capacitor)
pins: 1, 2

## GRM0335C1H120GA01D
designator C?  Capacitance: 12pF  (hidden comment: *)
Capacitor, Ceramic (MLCC), 12pF, ±2%, 50V, C0G, ±2%, SMD 0201; Manufacturer: Murata Electronics; Manufacturer Part Number: GRM0335C1H120GA01D; Package Size: 0201; JLCPCB Basic Part: No; JLCPCB Part Number: C161404; Supplier 1: LCSC; Category: Capacitors - MLCC; Supplier Part Number 1: C161404; Tolerance: ±2%; Voltage Rating: 50V; Temperature Coefficient: C0G; RoHS: Yes; ComponentLink1Description: Datasheet; ComponentLink1URL: https://wmsc.lcsc.com/wmsc/upload/file/pdf/v2/lcsc/2304140030_Murata-Electronics-GRM0335C1H120GA01D_C161404.pdf; ComponentLink2Description: JLCPCB Part URL; ComponentLink2URL: https://jlcpcb.com/partdetail/C161404; ComponentLink3Description: LCSC Part URL; ComponentLink3URL: https://lcsc.com/product-detail/Multilayer-Ceramic-Capacitors-MLCC---SMD-SMT_Murata-Electronics-Murata-Electronics-GRM0335C1H120GA01D_C161404.html
footprint CAP-0201 (0201 (0603M) Capacitor)
pins: 1, 2

## GRM0335C1H120JA01D
designator C?  Capacitance: 12pF  (hidden comment: *)
Capacitor, Ceramic (MLCC), 12pF, ±5%, 50V, C0G, ±5%, SMD 0201; Manufacturer: Murata Electronics; Manufacturer Part Number: GRM0335C1H120JA01D; Package Size: 0201; JLCPCB Basic Part: No; JLCPCB Part Number: C85890; Supplier 1: LCSC; Category: Capacitors - MLCC; Supplier Part Number 1: C85890; Tolerance: ±5%; Voltage Rating: 50V; Temperature Coefficient: C0G; RoHS: Yes; ComponentLink1Description: Datasheet; ComponentLink1URL: https://wmsc.lcsc.com/wmsc/upload/file/pdf/v2/lcsc/2304140030_Murata-Electronics-GRM0335C1H120JA01D_C85890.pdf; ComponentLink2Description: JLCPCB Part URL; ComponentLink2URL: https://jlcpcb.com/partdetail/C85890; ComponentLink3Description: LCSC Part URL; ComponentLink3URL: https://lcsc.com/product-detail/Multilayer-Ceramic-Capacitors-MLCC---SMD-SMT_Murata-Electronics-Murata-Electronics-GRM0335C1H120JA01D_C85890.html
footprint CAP-0201 (0201 (0603M) Capacitor)
pins: 1, 2

## GRM0335C1H121FA01D
designator C?  Capacitance: 120pF  (hidden comment: *)
Capacitor, Ceramic (MLCC), 120pF, ±1%, 50V, null, ±1%, SMD 0201; Manufacturer: Murata Electronics; Manufacturer Part Number: GRM0335C1H121FA01D; Package Size: 0201; JLCPCB Basic Part: No; JLCPCB Part Number: C1864389; Supplier 1: LCSC; Category: Capacitors - MLCC; Supplier Part Number 1: C1864389; Tolerance: ±1%; Voltage Rating: 50V; Temperature Coefficient: null; RoHS: Yes; ComponentLink1Description: Datasheet; ComponentLink1URL: https://wmsc.lcsc.com/wmsc/upload/file/pdf/v2/lcsc/2104061713_Murata-Electronics-GRM0335C1H121FA01D_C1864389.pdf; ComponentLink2Description: JLCPCB Part URL; ComponentLink2URL: https://jlcpcb.com/partdetail/C1864389; ComponentLink3Description: LCSC Part URL; ComponentLink3URL: https://lcsc.com/product-detail/Multilayer-Ceramic-Capacitors-MLCC---SMD-SMT_Murata-Electronics-Murata-Electronics-GRM0335C1H121FA01D_C1864389.html
footprint CAP-0201 (0201 (0603M) Capacitor)
pins: 1, 2

## GRM0335C1H121GA01D
designator C?  Capacitance: 120pF  (hidden comment: *)
Capacitor, Ceramic (MLCC), 120pF, ±2%, 50V, C0G, ±2%, SMD 0201; Manufacturer: Murata Electronics; Manufacturer Part Number: GRM0335C1H121GA01D; Package Size: 0201; JLCPCB Basic Part: No; JLCPCB Part Number: C161405; Supplier 1: LCSC; Category: Capacitors - MLCC; Supplier Part Number 1: C161405; Tolerance: ±2%; Voltage Rating: 50V; Temperature Coefficient: C0G; RoHS: Yes; ComponentLink1Description: Datasheet; ComponentLink1URL: https://wmsc.lcsc.com/wmsc/upload/file/pdf/v2/lcsc/1811081546_Murata-Electronics-GRM0335C1H121GA01D_C161405.pdf; ComponentLink2Description: JLCPCB Part URL; ComponentLink2URL: https://jlcpcb.com/partdetail/C161405; ComponentLink3Description: LCSC Part URL; ComponentLink3URL: https://lcsc.com/product-detail/Multilayer-Ceramic-Capacitors-MLCC---SMD-SMT_Murata-Electronics-Murata-Electronics-GRM0335C1H121GA01D_C161405.html
footprint CAP-0201 (0201 (0603M) Capacitor)
pins: 1, 2

## GRM0335C1H121JA01D
designator C?  Capacitance: 120pF  (hidden comment: *)
Capacitor, Ceramic (MLCC), 120pF, ±5%, 50V, C0G, ±5%, SMD 0201; Manufacturer: Murata Electronics; Manufacturer Part Number: GRM0335C1H121JA01D; Package Size: 0201; JLCPCB Basic Part: No; JLCPCB Part Number: C161406; Supplier 1: LCSC; Category: Capacitors - MLCC; Supplier Part Number 1: C161406; Tolerance: ±5%; Voltage Rating: 50V; Temperature Coefficient: C0G; RoHS: Yes; ComponentLink1Description: Datasheet; ComponentLink1URL: https://wmsc.lcsc.com/wmsc/upload/file/pdf/v2/lcsc/2304140030_Murata-Electronics-GRM0335C1H121JA01D_C161406.pdf; ComponentLink2Description: JLCPCB Part URL; ComponentLink2URL: https://jlcpcb.com/partdetail/C161406; ComponentLink3Description: LCSC Part URL; ComponentLink3URL: https://lcsc.com/product-detail/Multilayer-Ceramic-Capacitors-MLCC---SMD-SMT_Murata-Electronics-Murata-Electronics-GRM0335C1H121JA01D_C161406.html
footprint CAP-0201 (0201 (0603M) Capacitor)
pins: 1, 2

## GRM0335C1H130GA01D
designator C?  Capacitance: 13pF  (hidden comment: *)
Capacitor, Ceramic (MLCC), 13pF, ±2%, ±2%, SMD 0201; Manufacturer: Murata Electronics; Manufacturer Part Number: GRM0335C1H130GA01D; Package Size: 0201; JLCPCB Basic Part: No; JLCPCB Part Number: C384961; Supplier 1: LCSC; Category: Capacitors - MLCC; Supplier Part Number 1: C384961; Tolerance: ±2%; RoHS: Yes; ComponentLink1Description: Datasheet; ComponentLink1URL: https://wmsc.lcsc.com/wmsc/upload/file/pdf/v2/lcsc/2012231209_Murata-Electronics-GRM0335C1H130GA01D_C384961.pdf; ComponentLink2Description: JLCPCB Part URL; ComponentLink2URL: https://jlcpcb.com/partdetail/C384961; ComponentLink3Description: LCSC Part URL; ComponentLink3URL: https://lcsc.com/product-detail/Multilayer-Ceramic-Capacitors-MLCC---SMD-SMT_Murata-Electronics-Murata-Electronics-GRM0335C1H130GA01D_C384961.html
footprint CAP-0201 (0201 (0603M) Capacitor)
pins: 1, 2

## GRM0335C1H130JA01D
designator C?  Capacitance: 13pF  (hidden comment: *)
Capacitor, Ceramic (MLCC), 13pF, ±5%, 50V, C0G, ±5%, SMD 0201; Manufacturer: Murata Electronics; Manufacturer Part Number: GRM0335C1H130JA01D; Package Size: 0201; JLCPCB Basic Part: No; JLCPCB Part Number: C384962; Supplier 1: LCSC; Category: Capacitors - MLCC; Supplier Part Number 1: C384962; Tolerance: ±5%; Voltage Rating: 50V; Temperature Coefficient: C0G; RoHS: Yes; ComponentLink1Description: Datasheet; ComponentLink1URL: https://wmsc.lcsc.com/wmsc/upload/file/pdf/v2/lcsc/2304140030_Murata-Electronics-GRM0335C1H130JA01D_C384962.pdf; ComponentLink2Description: JLCPCB Part URL; ComponentLink2URL: https://jlcpcb.com/partdetail/C384962; ComponentLink3Description: LCSC Part URL; ComponentLink3URL: https://lcsc.com/product-detail/Multilayer-Ceramic-Capacitors-MLCC---SMD-SMT_Murata-Electronics-Murata-Electronics-GRM0335C1H130JA01D_C384962.html
footprint CAP-0201 (0201 (0603M) Capacitor)
pins: 1, 2

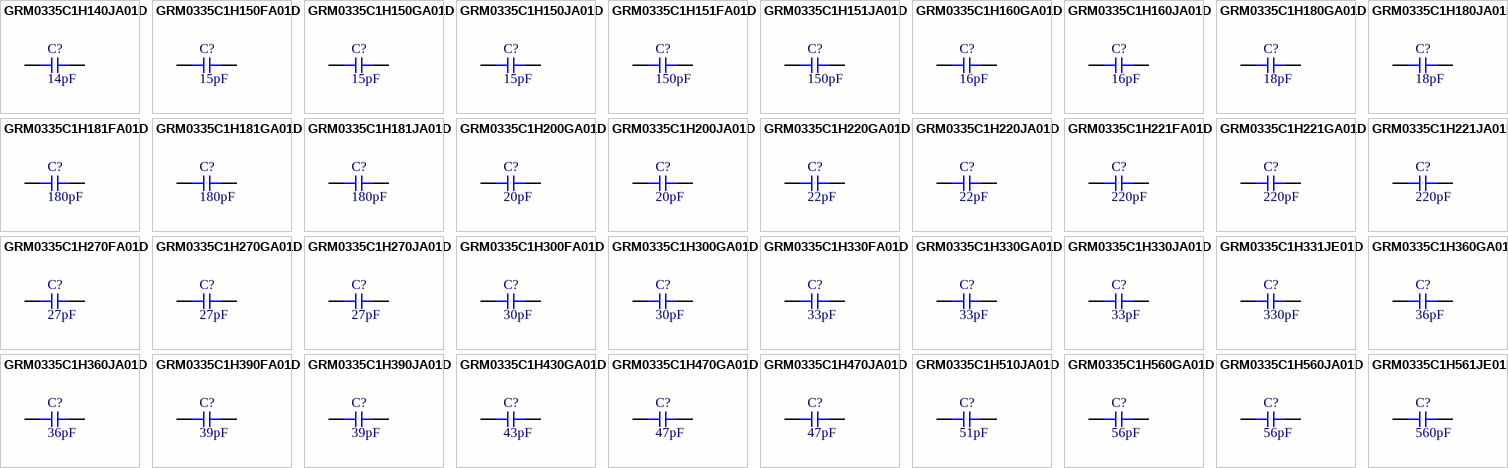
[diagram p24: symbols GRM0335C1H140JA01D to GRM0335C1H561JE01D]

## GRM0335C1H140JA01D
designator C?  Capacitance: 14pF  (hidden comment: *)
Capacitor, Ceramic (MLCC), 14pF, ±5%, 50V, C0G, ±5%, SMD 0201; Manufacturer: Murata Electronics; Manufacturer Part Number: GRM0335C1H140JA01D; Package Size: 0201; JLCPCB Basic Part: No; JLCPCB Part Number: C3034512; Supplier 1: LCSC; Category: Capacitors - MLCC; Supplier Part Number 1: C3034512; Tolerance: ±5%; Voltage Rating: 50V; Temperature Coefficient: C0G; RoHS: Yes; ComponentLink1Description: Datasheet; ComponentLink1URL: https://wmsc.lcsc.com/wmsc/upload/file/pdf/v2/lcsc/2209091800_Murata-Electronics-GRM0335C1H140JA01D_C3034512.pdf; ComponentLink2Description: JLCPCB Part URL; ComponentLink2URL: https://jlcpcb.com/partdetail/C3034512; ComponentLink3Description: LCSC Part URL; ComponentLink3URL: https://lcsc.com/product-detail/Multilayer-Ceramic-Capacitors-MLCC---SMD-SMT_Murata-Electronics-Murata-Electronics-GRM0335C1H140JA01D_C3034512.html
footprint CAP-0201 (0201 (0603M) Capacitor)
pins: 1, 2

## GRM0335C1H150FA01D
designator C?  Capacitance: 15pF  (hidden comment: *)
Capacitor, Ceramic (MLCC), 15pF, ±1%, 50V, C0G, ±1%, SMD 0201; Manufacturer: Murata Electronics; Manufacturer Part Number: GRM0335C1H150FA01D; Package Size: 0201; JLCPCB Basic Part: No; JLCPCB Part Number: C237567; Supplier 1: LCSC; Category: Capacitors - MLCC; Supplier Part Number 1: C237567; Tolerance: ±1%; Voltage Rating: 50V; Temperature Coefficient: C0G; RoHS: Yes; ComponentLink1Description: Datasheet; ComponentLink1URL: https://wmsc.lcsc.com/wmsc/upload/file/pdf/v2/lcsc/2304140030_Murata-Electronics-GRM0335C1H150FA01D_C237567.pdf; ComponentLink2Description: JLCPCB Part URL; ComponentLink2URL: https://jlcpcb.com/partdetail/C237567; ComponentLink3Description: LCSC Part URL; ComponentLink3URL: https://lcsc.com/product-detail/Multilayer-Ceramic-Capacitors-MLCC---SMD-SMT_Murata-Electronics-Murata-Electronics-GRM0335C1H150FA01D_C237567.html
footprint CAP-0201 (0201 (0603M) Capacitor)
pins: 1, 2

## GRM0335C1H150GA01D
designator C?  Capacitance: 15pF  (hidden comment: *)
Capacitor, Ceramic (MLCC), 15pF, ±2%, 50V, C0G, ±2%, SMD 0201; Manufacturer: Murata Electronics; Manufacturer Part Number: GRM0335C1H150GA01D; Package Size: 0201; JLCPCB Basic Part: No; JLCPCB Part Number: C161407; Supplier 1: LCSC; Category: Capacitors - MLCC; Supplier Part Number 1: C161407; Tolerance: ±2%; Voltage Rating: 50V; Temperature Coefficient: C0G; RoHS: Yes; ComponentLink1Description: Datasheet; ComponentLink1URL: https://wmsc.lcsc.com/wmsc/upload/file/pdf/v2/lcsc/1811081546_Murata-Electronics-GRM0335C1H150GA01D_C161407.pdf; ComponentLink2Description: JLCPCB Part URL; ComponentLink2URL: https://jlcpcb.com/partdetail/C161407; ComponentLink3Description: LCSC Part URL; ComponentLink3URL: https://lcsc.com/product-detail/Multilayer-Ceramic-Capacitors-MLCC---SMD-SMT_Murata-Electronics-Murata-Electronics-GRM0335C1H150GA01D_C161407.html
footprint CAP-0201 (0201 (0603M) Capacitor)
pins: 1, 2

## GRM0335C1H150JA01D
designator C?  Capacitance: 15pF  (hidden comment: *)
Capacitor, Ceramic (MLCC), 15pF, ±5%, 50V, C0G, ±5%, SMD 0201; Manufacturer: Murata Electronics; Manufacturer Part Number: GRM0335C1H150JA01D; Package Size: 0201; JLCPCB Basic Part: No; JLCPCB Part Number: C85891; Supplier 1: LCSC; Category: Capacitors - MLCC; Supplier Part Number 1: C85891; Tolerance: ±5%; Voltage Rating: 50V; Temperature Coefficient: C0G; RoHS: Yes; ComponentLink1Description: Datasheet; ComponentLink1URL: https://wmsc.lcsc.com/wmsc/upload/file/pdf/v2/lcsc/2304140030_Murata-Electronics-GRM0335C1H150JA01D_C85891.pdf; ComponentLink2Description: JLCPCB Part URL; ComponentLink2URL: https://jlcpcb.com/partdetail/C85891; ComponentLink3Description: LCSC Part URL; ComponentLink3URL: https://lcsc.com/product-detail/Multilayer-Ceramic-Capacitors-MLCC---SMD-SMT_Murata-Electronics-Murata-Electronics-GRM0335C1H150JA01D_C85891.html
footprint CAP-0201 (0201 (0603M) Capacitor)
pins: 1, 2
